# Altium integrated library Photocoupler.IntLib: 6 symbols
Pins are listed as number, name and electrical type; pins without a type are passive.

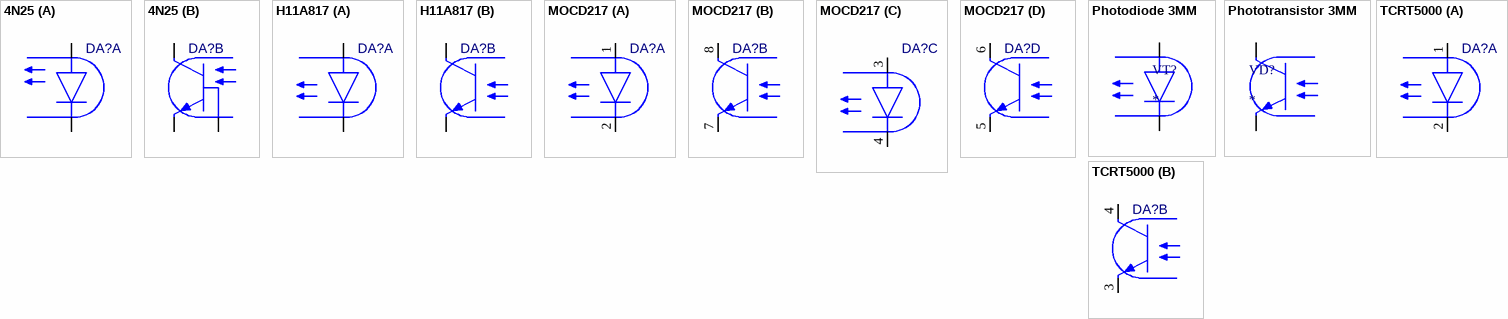
[diagram p0: symbols 4N25 to TCRT5000]

## 4N25
designator DA?  (value not drawn)
Value: *; ComponentDescription: 4N25
footprint SMDIP6
part A pins: 1 A, 2 K
part B pins: 4 E, 5 C, 6 B

## H11A817
designator DA?  (value not drawn)
Value: *; ComponentDescription: H11A817
footprint H11A
part A pins: 1 A, 2 K
part B pins: 3 E, 4 C

## MOCD217
designator DA?  (value not drawn)
Value: *; ComponentDescription: MOCD217
footprint SOIC127P600X175-8N (SOIC, 8-Leads, Body 4,90x3,90mm, Pitch 1,27mm, IPC Medium Density)
part A pins: 1 A, 2 K
part B pins: 7 E, 8 C
part C pins: 3 A, 4 K
part D pins: 5 E, 6 C

## Photodiode 3MM
designator VT?
ComponentDescription: *
footprint 3MM SMD
pins: 1 K, 2 A

## Phototransistor 3MM
designator VD?
ComponentDescription: *
footprint 3MM SMD
pins: 1 E, 2 C

## TCRT5000
designator DA?  (value not drawn)
Value: *; ComponentDescription: TCRT5000
footprint TCRT5000
part A pins: 1 A, 2 K
part B pins: 3 E, 4 C